# Altium footprint library SparkFun-Connectors.PCBLIB: 409 footprints (part 1 of 26)
Each footprint in its own frame and in the unit in brackets; x right, y up, seen from the top. Pads: shape width x height; smd on the part's side, far side on the other; paste and mask are expansions set on the pad; w line width, h text height; cw(c..) or ccw(c..) is an arc to the next point about the centre after c.
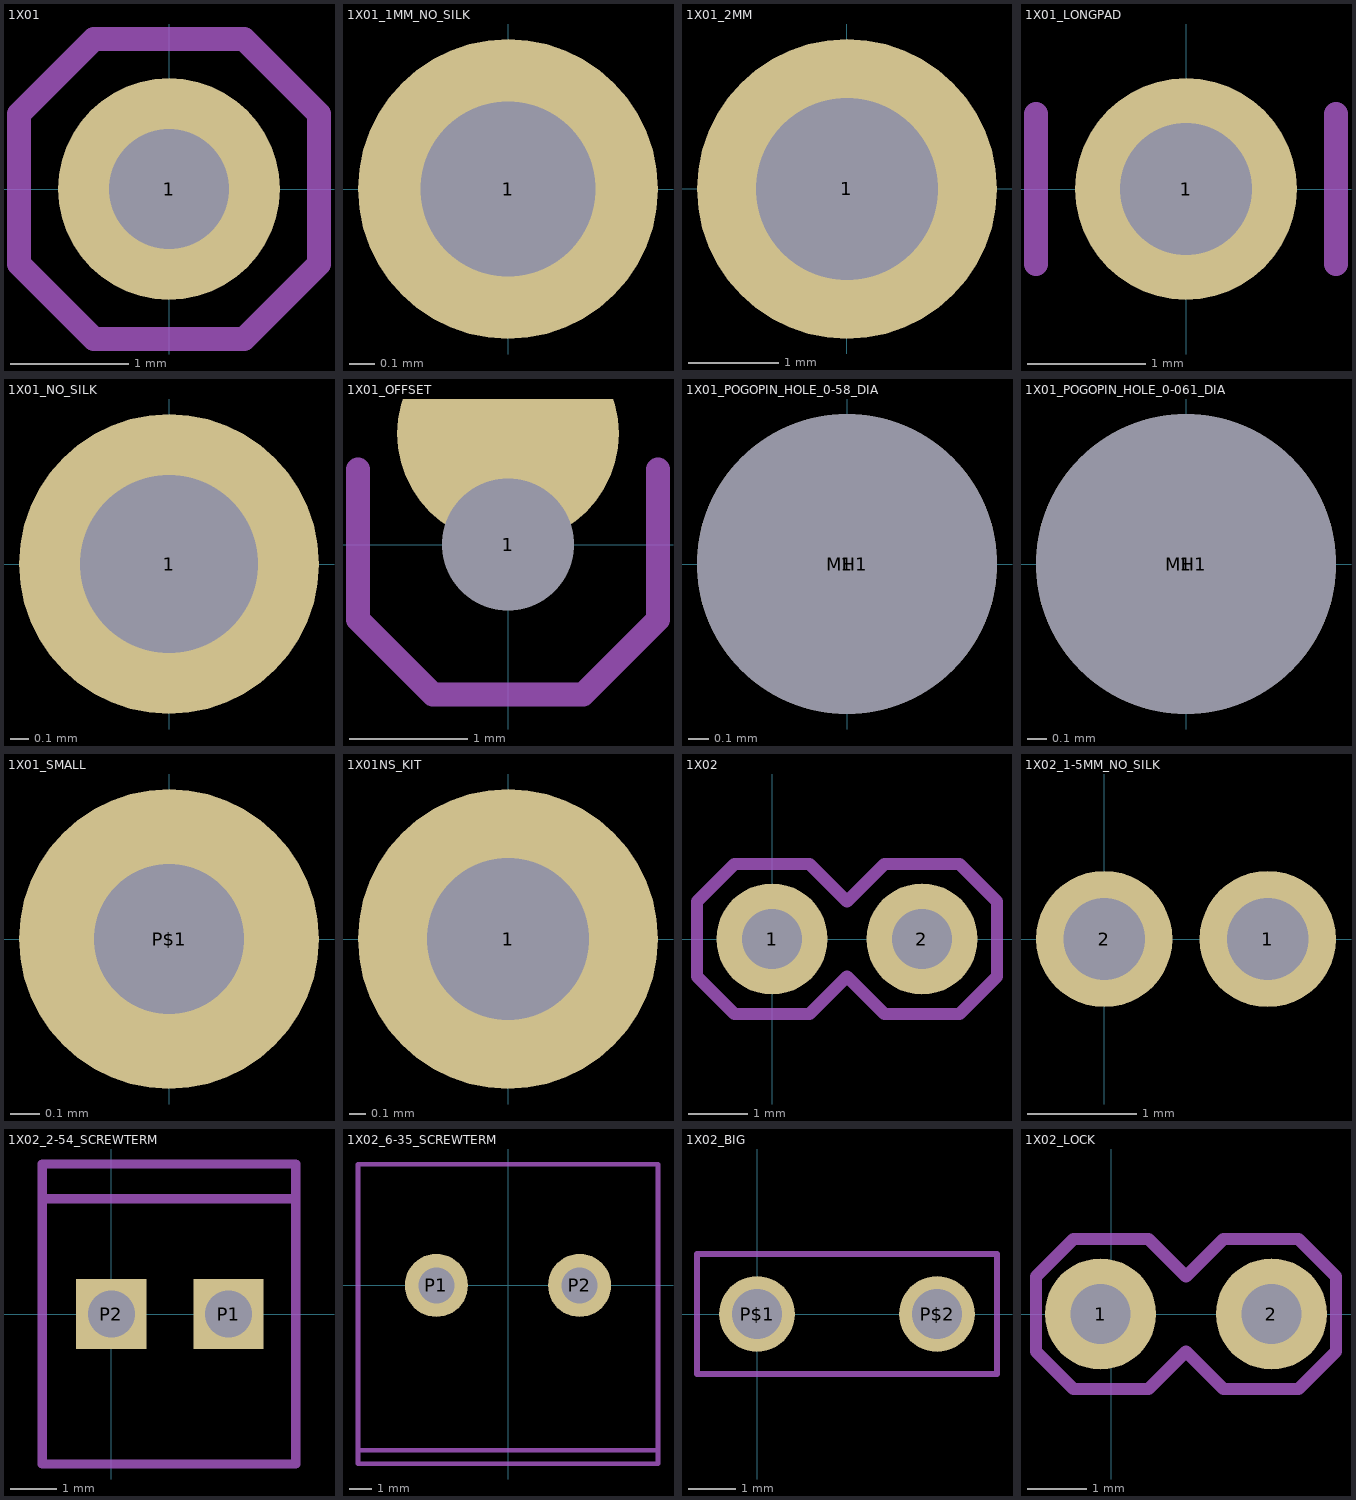
[diagram p0: the footprints below, top view; thin cyan lines are the x and y axes]

## 1X01 [mil]
pads (1):
  round 74 hole 40: 1(0,0)
tDocu:
  region: -10,-10 -10,10 10,10 10,-10
tPlace:
  lines w8: -50,-25 -50,25 -25,50 25,50 50,25 50,-25 25,-50 -25,-50 -50,-25

## 1X01_1MM_NO_SILK [mil]
pads (1):
  round 47.24 hole 27.56: 1(0,0)
tDocu:
  region: -10,-10 -10,10 10,10 10,-10

## 1X01_2MM [mil]
pads (1):
  round 130 hole 78.74: 1(0,0)

## 1X01_LONGPAD [mil]
pads (1):
  round 74 hole 44: 1(0,0)
tDocu:
  region: -10,-10 -10,10 10,10 10,-10
tPlace:
  lines w8: -50,-25 -50,25 ; 50,-25 50,25

## 1X01_NO_SILK [mil]
pads (1):
  round 62.99 hole 37.4: 1(0,0)
tDocu:
  region: -10,-10 -10,10 10,10 10,-10

## 1X01_OFFSET [mil]
pads (1):
  round 74 hole 44 copper offset 0,37: 1(0,0)
tDocu:
  region: -10,-10 -10,10 10,10 10,-10
tPlace:
  lines w8: -50,25 -50,-25 -25,-50 25,-50 50,-25 50,25

## 1X01_POGOPIN_HOLE_0-58_DIA [mil]
pads (2):
  round 35.43 hole 35.43: 1(0,0)
  round 58 hole 58 unplated: MH1(0,0)
tDocu:
  circle w5: c0,0 r25

## 1X01_POGOPIN_HOLE_0-061_DIA [mil]
pads (2):
  round 35.43 hole 35.43: 1(0,0)
  round 61 hole 61 unplated: MH1(0,0)
tDocu:
  circle w5: c0,0 r25

## 1X01_SMALL [mil]
pads (1):
  round 40 hole 20: P$1(0,0)

## 1X01NS_KIT [mil]
pads (1):
  round 74 hole 40: 1(0,0)
Top Solder:
  circle w0: c0,0 r20
Bottom Solder:
  circle w0: c0,0 r37

## 1X02 [mil]
pads (2):
  round 74 hole 40: 1(0,0) 2(100,0)
tDocu:
  region: 90,-10 90,10 110,10 110,-10
  region: -10,-10 -10,10 10,10 10,-10
tPlace:
  lines w8: -50,-25 -50,25 -25,50 25,50 50,25 75,50 125,50 150,25 150,-25 125,-50 75,-50 50,-25 25,-50 -25,-50 -50,-25

## 1X02_1-5MM_NO_SILK [mil]
pads (2):
  round 49.21 hole 29.53: 1(59.06,0) 2(0,0)
tDocu:
  region: 10,10 10,-10 -10,-10 -10,10
  region: 69.06,10 69.06,-10 49.06,-10 49.06,10

## 1X02_2-54_SCREWTERM [mil]
pads (2):
  rect 60x60 / inner round 55.43 / far side rect 60x60 hole 40: P1(100,0) P2(0,0)
tPlace:
  lines w8: -59.06,98.43 -59.06,-127.95 157.48,-127.95 157.48,98.43 ; -59.06,98.43 -59.06,127.95 157.48,127.95 157.48,98.43 ; -59.06,98.43 157.48,98.43

## 1X02_6-35_SCREWTERM [mil]
pads (2):
  round 110.24 hole 62.99: P1(-125,0) P2(125,0)
tPlace:
  lines w8: -261.81,-287.52 -261.81,-311.02 261.81,-311.02 261.81,-287.52 ; -261.81,-287.52 -261.81,211.1 261.81,211.1 261.81,-287.52 ; -261.81,-287.52 261.81,-287.52

## 1X02_BIG [mil]
pads (2):
  round 63 hole 42: P$1(0,0) P$2(150,0)
tPlace:
  lines w5: -50,-50 -50,50 200,50 200,-50 -50,-50

## 1X02_LOCK [mil]
pads (2):
  round 74 hole 40: 1(-7,0) 2(107,0)
tDocu:
  region: -11.5,-11.5 -11.5,11.5 11.5,11.5 11.5,-11.5
  region: 88.5,-11.5 88.5,11.5 111.5,11.5 111.5,-11.5
tPlace:
  lines w8: -50,-25 -50,25 -25,50 25,50 50,25 75,50 125,50 150,25 150,-25 125,-50 75,-50 50,-25 25,-50 -25,-50 -50,-25